# Altium footprint library Cap.PcbLib: 102 footprints (part 2 of 7)
Each footprint in its own frame and in the unit in brackets; x right, y up, seen from the top. Pads: shape width x height; smd on the part's side, far side on the other; paste and mask are expansions set on the pad; w line width, h text height; cw(c..) or ccw(c..) is an arc to the next point about the centre after c.
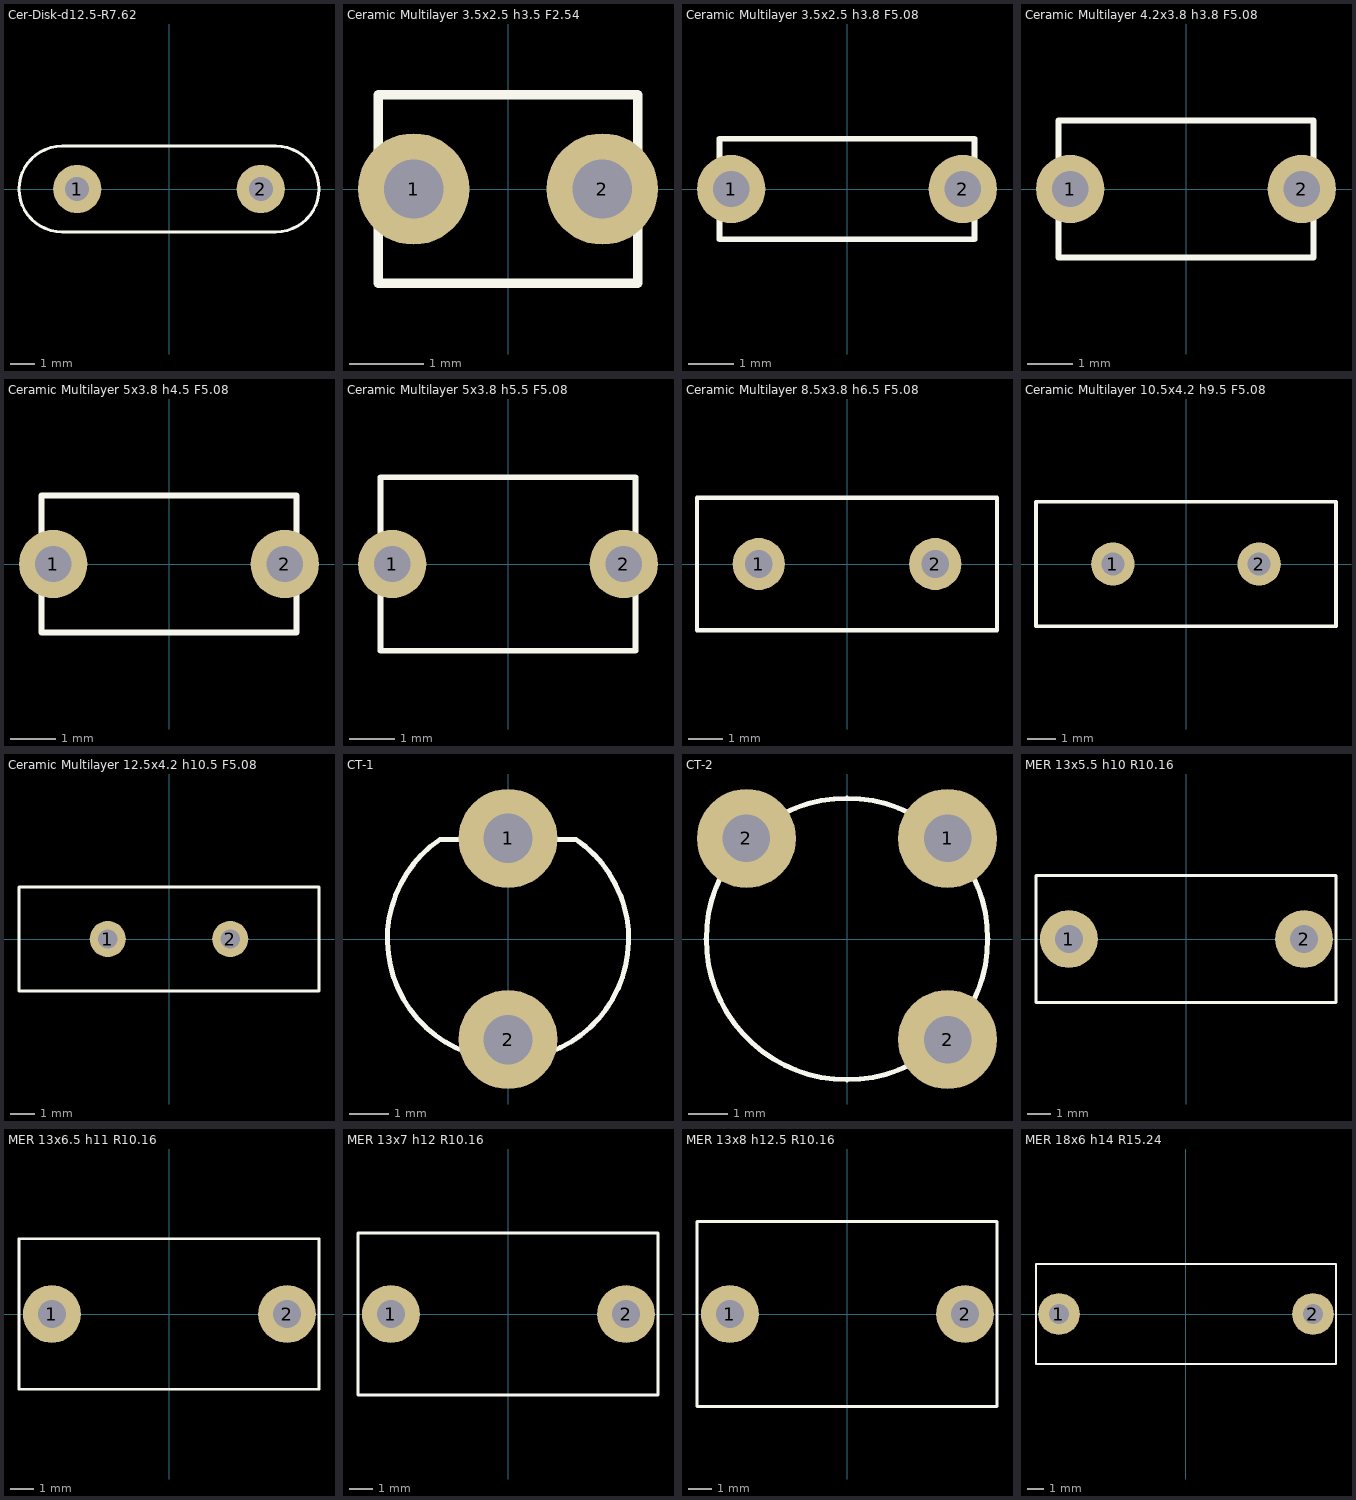
[diagram p1: the footprints below, top view; thin cyan lines are the x and y axes]

## Cer-Disk-d12.5-R7.62 [mm]
pads (2):
  round 2 hole 1: 1(-3.81,0) 2(3.81,0)
TopOverlay:
  lines w0.127: -4.445,-1.778 cw(c-4.445,0) -4.445,1.778 4.445,1.778 cw(c4.445,0) 4.445,-1.778 -4.445,-1.778
3D body: height 13.24, standoff -1.81, extent -6.245,-1.76 6.25,1.76

## Ceramic Multilayer 3.5x2.5 h3.5 F2.54 [mm]
pads (2):
  round 1.5 hole 0.8: 1(-1.27,0) 2(1.27,0)
TopOverlay:
  lines w0.127: -1.75,-1.27 -1.75,1.27 1.75,1.27 1.75,-1.27 -1.75,-1.27
3D body: height 4.5, standoff -1.54, extent -1.75,-1.25 1.75,1.25

## Ceramic Multilayer 3.5x2.5 h3.8 F5.08 [mm]
pads (2):
  round 1.5 hole 0.8: 1(-2.54,0) 2(2.54,0)
TopOverlay:
  lines w0.127: -2.794,-1.1 2.794,-1.1 2.794,1.1 -2.794,1.1 -2.794,-1.1
3D body: height 6.74, standoff -1.52, extent -2.794,-1.1 2.794,1.1

## Ceramic Multilayer 4.2x3.8 h3.8 F5.08 [mm]
pads (2):
  round 1.5 hole 0.8: 1(-2.54,0) 2(2.54,0)
TopOverlay:
  lines w0.127: -2.794,-1.5 -2.794,1.5 2.794,1.5 2.794,-1.5 -2.794,-1.5
3D body: height 6.74, standoff -1.52, extent -2.794,-1.5 2.794,1.5

## Ceramic Multilayer 5x3.8 h4.5 F5.08 [mm]
pads (2):
  round 1.5 hole 0.8: 1(-2.54,0) 2(2.54,0)
TopOverlay:
  lines w0.127: -2.794,-1.5 -2.794,1.5 2.794,1.5 2.794,-1.5 -2.794,-1.5
3D body: height 4.5, standoff -2.54, extent -2.9,-1.9 2.9,1.9

## Ceramic Multilayer 5x3.8 h5.5 F5.08 [mm]
pads (2):
  round 1.5 hole 0.8: 1(-2.54,0) 2(2.54,0)
TopOverlay:
  lines w0.127: -2.794,-1.905 2.794,-1.905 2.794,1.905 -2.794,1.905 -2.794,-1.905
3D body: height 6.77, standoff -2.54, extent -2.794,-1.9 2.794,1.9

## Ceramic Multilayer 8.5x3.8 h6.5 F5.08 [mm]
pads (2):
  round 1.5 hole 0.8: 1(-2.54,0) 2(2.54,0)
TopOverlay:
  lines w0.127: -4.318,-1.905 4.318,-1.905 4.318,1.905 -4.318,1.905 -4.318,-1.905
3D body: height 6.5, standoff -2.54, extent -4.25,-1.9 4.25,1.9

## Ceramic Multilayer 10.5x4.2 h9.5 F5.08 [mm]
pads (2):
  round 1.5 hole 0.8: 1(-2.54,0) 2(2.54,0)
TopOverlay:
  lines w0.127: -5.207,-2.159 5.207,-2.159 5.207,2.159 -5.207,2.159 -5.207,-2.159
3D body: height 9.5, standoff -2.54, extent -5.25,-2.1 5.25,2.1

## Ceramic Multilayer 12.5x4.2 h10.5 F5.08 [mm]
pads (2):
  round 1.5 hole 0.8: 1(-2.54,0) 2(2.54,0)
TopOverlay:
  lines w0.127: -6.223,-2.159 6.223,-2.159 6.223,2.159 -6.223,2.159 -6.223,-2.159
3D body: height 10.5, standoff -2.54, extent -6.25,-2.1 6.25,2.1

## CT-1 [mm]
pads (2):
  round 2.5 hole 1.25: 1(0,2.54) 2(0,-2.54)
TopOverlay:
  lines w0.127: -1.717,2.518 ccw(c0,0) 1.721,2.516 -1.717,2.518
3D body: height 5.55, standoff -2, extent -2.973,-2.973 2.973,3.009

## CT-2 [mm]
pads (3):
  round 2.5 hole 1.2: 1(2.54,2.54) 2(-2.54,2.54) 2(2.54,-2.54)
TopOverlay:
  circle w0.127: c0,0 r3.556

## MER 13x5.5 h10 R10.16 [mm]
pads (2):
  round 2.5 hole 1.2: 1(-5.08,0) 2(5.08,0)
TopOverlay:
  lines w0.127: -6.5,-2.75 6.46,-2.75 6.46,2.75 -6.5,2.75 -6.5,-2.75
3D body: height 11, standoff -2, extent -6.5,-2.75 6.5,2.75

## MER 13x6.5 h11 R10.16 [mm]
pads (2):
  round 2.5 hole 1.2: 1(-5.08,0) 2(5.08,0)
TopOverlay:
  lines w0.127: -6.5,-3.25 -6.5,3.25 6.46,3.25 6.46,-3.25 -6.5,-3.25
3D body: height 12, standoff -2, extent -6.5,-3.25 6.5,3.25

## MER 13x7 h12 R10.16 [mm]
pads (2):
  round 2.5 hole 1.2: 1(-5.08,0) 2(5.08,0)
TopOverlay:
  lines w0.127: -6.5,-3.5 6.46,-3.5 6.46,3.5 -6.5,3.5 -6.5,-3.5
3D body: height 13, standoff -2, extent -6.5,-3.5 6.5,3.5

## MER 13x8 h12.5 R10.16 [mm]
pads (2):
  round 2.5 hole 1.2: 1(-5.08,0) 2(5.08,0)
TopOverlay:
  lines w0.127: -6.5,-4 -6.5,4 6.46,4 6.46,-4 -6.5,-4
3D body: height 13.5, standoff -2, extent -6.5,-4 6.5,4

## MER 18x6 h14 R15.24 [mm]
pads (2):
  round 2.5 hole 1.2: 1(-7.62,0) 2(7.62,0)
TopOverlay:
  lines w0.127: -9,-3 -9,3 9,3 9,-3 -9,-3
3D body: height 15, standoff -2, extent -9,-3 9,3